# Altium footprint library 20210518.PcbLib: 414 footprints (part 21 of 26)
Each footprint in its own frame and in the unit in brackets; x right, y up, seen from the top. Pads: shape width x height; smd on the part's side, far side on the other; paste and mask are expansions set on the pad; w line width, h text height; cw(c..) or ccw(c..) is an arc to the next point about the centre after c.
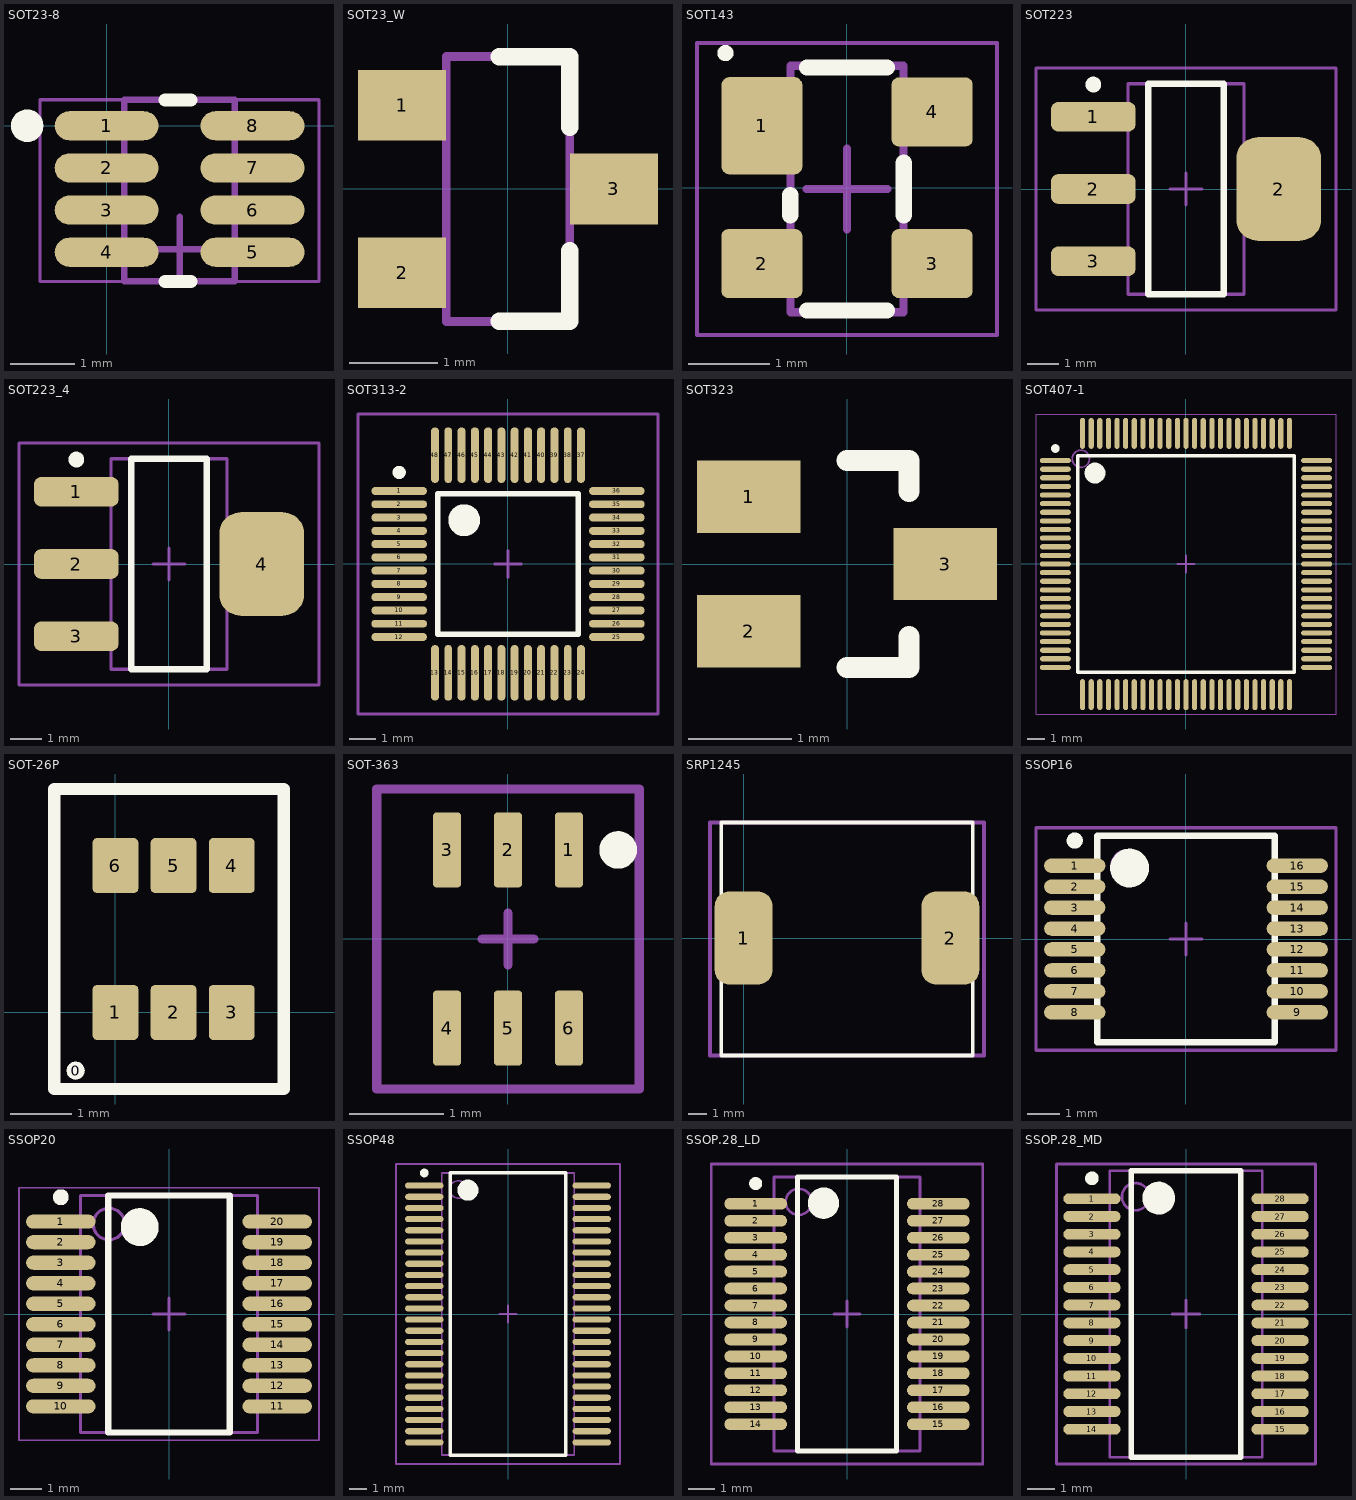
[diagram p20: the footprints below, top view; thin cyan lines are the x and y axes]

## SOT23-8 [mm] "SOT 8-Leads, Body 2,90x1,60mm, Pitch 1,27mm, IPC Medium Density"
height 1.45
pads (8):
  oval 1.6x0.45 smd: 1(0,0) 2(0,-0.65) 3(0,-1.3) 4(0,-1.95) 5(2.25,-1.95) 6(2.25,-1.3) 7(2.25,-0.65) 8(2.25,0)
Top Overlay:
  circle w0.25: c-1.225,0 r0.125
  lines w0.2: 0.9,-2.4 1.3,-2.4 ; 0.9,0.4 1.3,0.4
Mechanical 13:
  lines w0.1: 0.275,-2.4 0.275,0.4 1.975,0.4 1.975,-2.4 0.275,-2.4
Mechanical 15:
  lines w0.05: -1.025,-2.4 -1.025,0.4 3.275,0.4 3.275,-2.4 -1.025,-2.4
  lines w0.1: 0.625,-1.905 1.625,-1.905 ; 1.125,-2.405 1.125,-1.405
3D body: height 1.2, standoff 0, extent -0.3,-2.47 2.5,0.47

## SOT23_W [mm] "SOT23, 3-Leads, Body 2.9x1.3mm, Pitch 0.95mm, Lead Span 2.3mm, IPC High Density"
height 1.1
pads (3):
  rect 1x0.8 smd: 1(-1.2,0.95) 2(-1.2,-0.95) 3(1.2,0)
Top Overlay:
  lines w0.2: -0.1,-1.5 0.7,-1.5 0.7,-0.7 ; -0.1,1.5 0.7,1.5 0.7,0.7
Mechanical 13:
  lines w0.1: -0.7,-1.5 0.7,-1.5 0.7,1.5 -0.7,1.5 -0.7,-1.5
3D body: height 0.97, standoff -0.01, extent -1.274,-1.46 1.274,1.46

## SOT143 [mm]
height 1.14
pads (4):
  rrect20% 1x1.2 smd: 1(-1.05,0.765)
  rrect20% 1x0.85 smd: 2(-1.05,-0.935) 3(1.05,-0.935) 4(1.05,0.935)
Top Overlay:
  circle w0.1: c-1.499,1.661 r0.05
  lines w0.2: -0.7,-0.34 -0.7,-0.09 ; -0.495,-1.515 0.495,-1.515 ; -0.495,1.485 0.495,1.485 ; 0.7,-0.34 0.7,0.31
Mechanical 13:
  lines w0.1: -0.695,-1.535 0.695,-1.535 0.695,1.505 -0.695,1.505 -0.695,-1.535
Mechanical 15:
  lines w0.05: -1.85,-1.815 1.85,-1.815 1.85,1.785 -1.85,1.785 -1.85,-1.815
  lines w0.1: -0.5,-0.015 0.5,-0.015 ; 0,-0.515 0,0.485
3D body: height 1, standoff 0, extent -1.21,-1.475 1.21,1.445

## SOT223 [mm] "SOT223, 4-Leads, Body 6,7x7,3mm (max), Pitch 2,30mm, IPC Low Density"
height 1.8
pads (4):
  rrect50% 2.7x0.95 smd: 1(-2.95,2.3) 2(-2.95,0) 3(-2.95,-2.3)
  rrect50% 2.7x3.3 smd: 2(2.95,0)
Top Overlay:
  circle w0.25: c-2.95,3.325 r0.125
  lines w0.2: -1.2,-3.35 1.2,-3.35 1.2,3.35 -1.2,3.35 -1.2,-3.35
Mechanical 13:
  lines w0.1: -1.85,-3.35 1.85,-3.35 1.85,3.35 -1.85,3.35 -1.85,-3.35
Mechanical 15:
  lines w0.1: -0.5,0 0.5,0 ; 0,-0.5 0,0.5 ; -4.775,-3.85 4.775,-3.85 4.775,3.85 -4.775,3.85 -4.775,-3.85
3D body: height 1.68, standoff -0.01, extent -3.58,-3.25 3.38,3.25

## SOT223_4 [mm] "SOT223, 4-Leads, Body 6,7x7,3mm (max), Pitch 2,30mm, IPC Low Density"
height 1.8
pads (4):
  rrect50% 2.7x0.95 smd: 1(-2.95,2.3) 2(-2.95,0) 3(-2.95,-2.3)
  rrect50% 2.7x3.3 smd: 4(2.95,0)
Top Overlay:
  circle w0.25: c-2.95,3.325 r0.125
  lines w0.2: -1.2,-3.35 1.2,-3.35 1.2,3.35 -1.2,3.35 -1.2,-3.35
Mechanical 13:
  lines w0.1: -1.85,-3.35 1.85,-3.35 1.85,3.35 -1.85,3.35 -1.85,-3.35
Mechanical 15:
  lines w0.1: -0.5,0 0.5,0 ; 0,-0.5 0,0.5 ; -4.775,-3.85 4.775,-3.85 4.775,3.85 -4.775,3.85 -4.775,-3.85
3D body: height 1.68, standoff -0.01, extent -3.58,-3.25 3.38,3.25

## SOT313-2 [mm] "Thin QFP, 48-Leads, Body 7x7mm, Pitch 0.5mm, IPC Low Density"
height 1.6
pads (48):
  oval 2.1x0.3 smd: 1(-4.1,2.75) 2(-4.1,2.25) 3(-4.1,1.75) 4(-4.1,1.25) 5(-4.1,0.75) 6(-4.1,0.25) 7(-4.1,-0.25) 8(-4.1,-0.75) 9(-4.1,-1.25) 10(-4.1,-1.75) 11(-4.1,-2.25) 12(-4.1,-2.75) 25(4.1,-2.75) 26(4.1,-2.25) 27(4.1,-1.75) 28(4.1,-1.25) 29(4.1,-0.75) 30(4.1,-0.25) 31(4.1,0.25) 32(4.1,0.75) 33(4.1,1.25) 34(4.1,1.75) 35(4.1,2.25) 36(4.1,2.75)
  oval 0.3x2.1 smd: 13(-2.75,-4.1) 14(-2.25,-4.1) 15(-1.75,-4.1) 16(-1.25,-4.1) 17(-0.75,-4.1) 18(-0.25,-4.1) 19(0.25,-4.1) 20(0.75,-4.1) 21(1.25,-4.1) 22(1.75,-4.1) 23(2.25,-4.1) 24(2.75,-4.1) 37(2.75,4.1) 38(2.25,4.1) 39(1.75,4.1) 40(1.25,4.1) 41(0.75,4.1) 42(0.25,4.1) 43(-0.25,4.1) 44(-0.75,4.1) 45(-1.25,4.1) 46(-1.75,4.1) 47(-2.25,4.1) 48(-2.75,4.1)
Top Overlay:
  circle w0.25: c-4.1,3.45 r0.125
  circle w0.6: c-1.65,1.65 r0.3
  lines w0.2: -2.65,-2.65 -2.65,2.65 2.65,2.65 2.65,-2.65 -2.65,-2.65
Mechanical 15:
  lines w0.1: -0.5,0 0.5,0 ; 0,-0.5 0,0.5 ; -5.65,-5.65 -5.65,5.65 5.65,5.65 5.65,-5.65 -5.65,-5.65
3D body: height 1.6, standoff 0, extent -4.5,-4.5 4.5,4.5

## SOT323 [mm]
pads (3):
  rect 1x0.7 smd: 1(-0.95,0.65) 2(-0.95,-0.65) 3(0.95,0)
Top Overlay:
  lines w0.2: 0,-1 0.6,-1 0.6,-0.7 ; 0,1 0.6,1 0.6,0.7
3D body: height 1, standoff 0, extent -1.15,-1.05 1.15,1.05

## SOT407-1 [mm] "TSQFP, 100-Leads, Body 14,00x14,00mm, Pitch 0,50mm, IPC Medium Density"
height 1.6
pads (100):
  oval 1.8x0.3 smd: 1(-7.575,6) 2(-7.575,5.5) 3(-7.575,5) 4(-7.575,4.5) 5(-7.575,4) 6(-7.575,3.5) 7(-7.575,3) 8(-7.575,2.5) 9(-7.575,2) 10(-7.575,1.5) 11(-7.575,1) 12(-7.575,0.5) 13(-7.575,0) 14(-7.575,-0.5) 15(-7.575,-1) 16(-7.575,-1.5) 17(-7.575,-2) 18(-7.575,-2.5) 19(-7.575,-3) 20(-7.575,-3.5) 21(-7.575,-4) 22(-7.575,-4.5) 23(-7.575,-5) 24(-7.575,-5.5) 25(-7.575,-6) 51(7.575,-6) 52(7.575,-5.5) 53(7.575,-5) 54(7.575,-4.5) 55(7.575,-4) 56(7.575,-3.5) 57(7.575,-3) 58(7.575,-2.5) 59(7.575,-2) 60(7.575,-1.5) 61(7.575,-1) 62(7.575,-0.5) 63(7.575,0) 64(7.575,0.5) 65(7.575,1) 66(7.575,1.5) 67(7.575,2) 68(7.575,2.5) 69(7.575,3) 70(7.575,3.5) 71(7.575,4) 72(7.575,4.5) 73(7.575,5) 74(7.575,5.5) 75(7.575,6)
  oval 0.3x1.8 smd: 26(-6,-7.575) 27(-5.5,-7.575) 28(-5,-7.575) 29(-4.5,-7.575) 30(-4,-7.575) 31(-3.5,-7.575) 32(-3,-7.575) 33(-2.5,-7.575) 34(-2,-7.575) 35(-1.5,-7.575) 36(-1,-7.575) 37(-0.5,-7.575) 38(0,-7.575) 39(0.5,-7.575) 40(1,-7.575) 41(1.5,-7.575) 42(2,-7.575) 43(2.5,-7.575) 44(3,-7.575) 45(3.5,-7.575) 46(4,-7.575) 47(4.5,-7.575) 48(5,-7.575) 49(5.5,-7.575) 50(6,-7.575) 76(6,7.575) 77(5.5,7.575) 78(5,7.575) 79(4.5,7.575) 80(4,7.575) 81(3.5,7.575) 82(3,7.575) 83(2.5,7.575) 84(2,7.575) 85(1.5,7.575) 86(1,7.575) 87(0.5,7.575) 88(0,7.575) 89(-0.5,7.575) 90(-1,7.575) 91(-1.5,7.575) 92(-2,7.575) 93(-2.5,7.575) 94(-3,7.575) 95(-3.5,7.575) 96(-4,7.575) 97(-4.5,7.575) 98(-5,7.575) 99(-5.5,7.575) 100(-6,7.575)
Top Overlay:
  circle w0.6: c-5.275,5.275 r0.3
  circle w0.25: c-7.575,6.7 r0.125
  lines w0.2: -6.275,-6.275 6.275,-6.275 6.275,6.275 -6.275,6.275 -6.275,-6.275
Mechanical 13:
  circle w0.1: c-6.1,6.1 r0.5
Mechanical 15:
  lines w0.05: -8.7,-8.7 8.7,-8.7 8.7,8.7 -8.7,8.7 -8.7,-8.7
  lines w0.1: -0.5,0 0.5,0 ; 0,-0.5 0,0.5
3D body: height 1.6, standoff 0, extent -8,-8 8,8

## SOT-26P [mm]
height 1.5
pads (7):
  round 0.3 on Top Overlay: 0(-0.65,-0.95)
  rrect20% 0.75x0.9 smd: 1(0,0) 2(0.95,0) 3(1.9,0) 4(1.9,2.4) 5(0.95,2.4) 6(0,2.4)
Top Overlay:
  lines w0.2: -1,-1.25 -1,3.65 2.75,3.65 2.75,-1.25 -1,-1.25
3D body: height 1.45, standoff 0.01, extent -0.675,0.25 2.575,2.175

## SOT-363 [mm]
pads (6):
  rrect25% 0.3x0.8 smd mask+0.051: 1(0.65,0.95) 2(0,0.95) 3(-0.65,0.95) 4(-0.65,-0.95) 5(0,-0.95) 6(0.65,-0.95)
Top Overlay:
  circle w0.2: c1.175,0.95 r0.1
Mechanical 15:
  lines w0.1: -0.275,0 0.275,0 ; 0,-0.275 0,0.275 ; -1.4,-1.6 1.4,-1.6 1.4,1.6 -1.4,1.6 -1.4,-1.6
3D body: height 1, standoff 0, extent -1.05,-1.15 1.05,1.15

## SRP1245 [mm] "SRP1245 Series Bourns Inductor"
pads (2):
  rrect50% 3.1x5 smd: 1(0,0) 2(11.1,0)
Top Overlay:
  lines w0.2: -1.2,-6.3 -1.2,6.2 12.3,6.2 12.3,-6.3 -1.2,-6.3
Mechanical 15:
  lines w0.2: -1.8,-6.3 12.9,-6.3 12.9,6.2 -1.8,6.2 -1.8,-6.3
3D body: height 5, standoff 0, extent -0.8,-6.4 12.1,6.1

## SSOP16 [mm] "SOP, 16-Leads, Body 6,4x5,5mm (max), Pitch 0,65mm, IPC Medium Density"
height 1.85
pads (16):
  oval 1.9x0.45 smd: 1(-3.45,2.275) 2(-3.45,1.625) 3(-3.45,0.975) 4(-3.45,0.325) 5(-3.45,-0.325) 6(-3.45,-0.975) 7(-3.45,-1.625) 8(-3.45,-2.275) 9(3.45,-2.275) 10(3.45,-1.625) 11(3.45,-0.975) 12(3.45,-0.325) 13(3.45,0.325) 14(3.45,0.975) 15(3.45,1.625) 16(3.45,2.275)
Top Overlay:
  circle w0.25: c-3.45,3.05 r0.125
  circle w0.6: c-1.75,2.2 r0.3
  lines w0.2: -2.75,-3.2 -2.75,3.2 2.75,3.2 2.75,-3.2 -2.75,-3.2
Mechanical 13:
  circle w0.1: c-1.8,2.25 r0.5
  lines w0.1: -2.75,-3.2 -2.75,3.2 2.75,3.2 2.75,-3.2 -2.75,-3.2
Mechanical 15:
  lines w0.1: -0.5,0 0.5,0 ; 0,-0.5 0,0.5 ; -4.65,-3.45 -4.65,3.45 4.65,3.45 4.65,-3.45 -4.65,-3.45
3D body: height 2.15, standoff 0, extent -3.903,-3.2 3.903,3.2

## SSOP20 [mm] "SOP, 20-Leads, Body 7,20x5,30mm, Pitch 0,65mm, IPC Medium Density"
height 2.13
pads (20):
  oval 2.2x0.45 smd: 1(-3.425,2.925) 2(-3.425,2.275) 3(-3.425,1.625) 4(-3.425,0.975) 5(-3.425,0.325) 6(-3.425,-0.325) 7(-3.425,-0.975) 8(-3.425,-1.625) 9(-3.425,-2.275) 10(-3.425,-2.925) 11(3.425,-2.925) 12(3.425,-2.275) 13(3.425,-1.625) 14(3.425,-0.975) 15(3.425,-0.325) 16(3.425,0.325) 17(3.425,0.975) 18(3.425,1.625) 19(3.425,2.275) 20(3.425,2.925)
Top Overlay:
  circle w0.6: c-0.925,2.75 r0.3
  circle w0.25: c-3.425,3.7 r0.125
  lines w0.2: -1.925,-3.75 1.925,-3.75 1.925,3.75 -1.925,3.75 -1.925,-3.75
Mechanical 13:
  circle w0.1: c-1.9,2.85 r0.5
  lines w0.1: -2.8,-3.75 2.8,-3.75 2.8,3.75 -2.8,3.75 -2.8,-3.75
Mechanical 15:
  lines w0.05: -4.75,-4 4.75,-4 4.75,4 -4.75,4 -4.75,-4
  lines w0.1: -0.5,0 0.5,0 ; 0,-0.5 0,0.5
3D body: height 1.78, standoff -0.21, extent -3.975,-3.665 3.925,3.665

## SSOP48 [mm] "SOP, 48-Leads, Body 16,2x7,6mm (max), Pitch 0,64mm, IPC Low Density"
height 2.76
pads (48):
  oval 2.2x0.35 smd: 1(-4.8,7.36) 2(-4.8,6.72) 3(-4.8,6.08) 4(-4.8,5.44) 5(-4.8,4.8) 6(-4.8,4.16) 7(-4.8,3.52) 8(-4.8,2.88) 9(-4.8,2.24) 10(-4.8,1.6) 11(-4.8,0.96) 12(-4.8,0.32) 13(-4.8,-0.32) 14(-4.8,-0.96) 15(-4.8,-1.6) 16(-4.8,-2.24) 17(-4.8,-2.88) 18(-4.8,-3.52) 19(-4.8,-4.16) 20(-4.8,-4.8) 21(-4.8,-5.44) 22(-4.8,-6.08) 23(-4.8,-6.72) 24(-4.8,-7.36) 25(4.8,-7.36) 26(4.8,-6.72) 27(4.8,-6.08) 28(4.8,-5.44) 29(4.8,-4.8) 30(4.8,-4.16) 31(4.8,-3.52) 32(4.8,-2.88) 33(4.8,-2.24) 34(4.8,-1.6) 35(4.8,-0.96) 36(4.8,-0.32) 37(4.8,0.32) 38(4.8,0.96) 39(4.8,1.6) 40(4.8,2.24) 41(4.8,2.88) 42(4.8,3.52) 43(4.8,4.16) 44(4.8,4.8) 45(4.8,5.44) 46(4.8,6.08) 47(4.8,6.72) 48(4.8,7.36)
Top Overlay:
  circle w0.6: c-2.3,7.1 r0.3
  circle w0.25: c-4.8,8.085 r0.125
  lines w0.2: -3.3,-8.1 3.3,-8.1 3.3,8.1 -3.3,8.1 -3.3,-8.1
Mechanical 13:
  circle w0.1: c-2.845,7.14 r0.5
  lines w0.1: -3.795,-8.09 3.795,-8.09 3.795,8.09 -3.795,8.09 -3.795,-8.09
Mechanical 15:
  lines w0.1: -0.5,0 0.5,0 ; 0,-0.5 0,0.5 ; -6.425,-8.6 6.425,-8.6 6.425,8.6 -6.425,8.6 -6.425,-8.6
3D body: height 2.6, standoff -0.05, extent -5.1,-8 5.3,8

## SSOP.28_LD [mm] "SOP, 28-Leads, Body 10.5x5.6mm (max), Pitch 0.65mm, IPC Low Density"
height 2
pads (28):
  oval 2.4x0.45 smd: 1(-3.5,4.225) 2(-3.5,3.575) 3(-3.5,2.925) 4(-3.5,2.275) 5(-3.5,1.625) 6(-3.5,0.975) 7(-3.5,0.325) 8(-3.5,-0.325) 9(-3.5,-0.975) 10(-3.5,-1.625) 11(-3.5,-2.275) 12(-3.5,-2.925) 13(-3.5,-3.575) 14(-3.5,-4.225) 15(3.5,-4.225) 16(3.5,-3.575) 17(3.5,-2.925) 18(3.5,-2.275) 19(3.5,-1.625) 20(3.5,-0.975) 21(3.5,-0.325) 22(3.5,0.325) 23(3.5,0.975) 24(3.5,1.625) 25(3.5,2.275) 26(3.5,2.925) 27(3.5,3.575) 28(3.5,4.225)
Top Overlay:
  circle w0.6: c-0.9,4.25 r0.3
  circle w0.25: c-3.5,5 r0.125
  lines w0.2: -1.9,-5.25 1.9,-5.25 1.9,5.25 -1.9,5.25 -1.9,-5.25
Mechanical 13:
  circle w0.1: c-1.85,4.3 r0.5
  lines w0.1: -2.8,-5.25 2.8,-5.25 2.8,5.25 -2.8,5.25 -2.8,-5.25
Mechanical 15:
  lines w0.1: -0.5,0 0.5,0 ; 0,-0.5 0,0.5 ; -5.2,-5.75 5.2,-5.75 5.2,5.75 -5.2,5.75 -5.2,-5.75
3D body: height 1.92, standoff -0.03, extent -4.025,-5.225 4.2,5.275

## SSOP.28_MD [mm] "SSOP, 28-Leads, Body 10,5x5,6mm (max), Pitch 0,65mm, IPC Medium Density"
height 2
pads (28):
  oval 2.1x0.4 smd: 1(-3.45,4.225) 2(-3.45,3.575) 3(-3.45,2.925) 4(-3.45,2.275) 5(-3.45,1.625) 6(-3.45,0.975) 7(-3.45,0.325) 8(-3.45,-0.325) 9(-3.45,-0.975) 10(-3.45,-1.625) 11(-3.45,-2.275) 12(-3.45,-2.925) 13(-3.45,-3.575) 14(-3.45,-4.225) 15(3.45,-4.225) 16(3.45,-3.575) 17(3.45,-2.925) 18(3.45,-2.275) 19(3.45,-1.625) 20(3.45,-0.975) 21(3.45,-0.325) 22(3.45,0.325) 23(3.45,0.975) 24(3.45,1.625) 25(3.45,2.275) 26(3.45,2.925) 27(3.45,3.575) 28(3.45,4.225)
Top Overlay:
  circle w0.25: c-3.45,4.975 r0.125
  circle w0.6: c-1,4.25 r0.3
  lines w0.2: -2,-5.25 -2,5.25 2,5.25 2,-5.25 -2,-5.25
Mechanical 13:
  circle w0.1: c-1.85,4.3 r0.5
  lines w0.1: -2.8,-5.25 -2.8,5.25 2.8,5.25 2.8,-5.25 -2.8,-5.25
Mechanical 15:
  lines w0.1: -0.5,0 0.5,0 ; 0,-0.5 0,0.5 ; -4.75,-5.5 -4.75,5.5 4.75,5.5 4.75,-5.5 -4.75,-5.5
3D body: height 1.92, standoff -0.03, extent -4.075,-5.25 4.15,5.25